# Altium footprint library connectors.PcbLib: 98 footprints (part 7 of 7)
Each footprint in its own frame and in the unit in brackets; x right, y up, seen from the top. Pads: shape width x height; smd on the part's side, far side on the other; paste and mask are expansions set on the pad; w line width, h text height; cw(c..) or ccw(c..) is an arc to the next point about the centre after c.
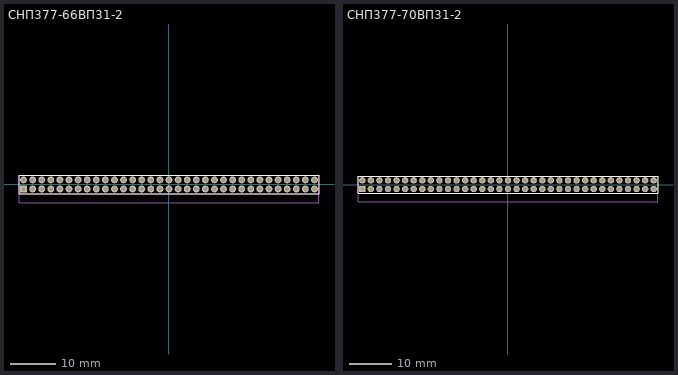
[diagram p6: the footprints below, top view; thin cyan lines are the x and y axes]

## СНП377-66ВП31-2 [mm] "Вилка серии СНП377, угловая, двухрядная, 66 выводов"
height 4
pads (66):
  rect 1.5x1.5 hole 0.9: 1(-32,-1)
  round 1.5 hole 0.9: 2(-32,1) 3(-30,-1) 4(-30,1) 5(-28,-1) 6(-28,1) 7(-26,-1) 8(-26,1) 9(-24,-1) 10(-24,1) 11(-22,-1) 12(-22,1) 13(-20,-1) 14(-20,1) 15(-18,-1) 16(-18,1) 17(-16,-1) 18(-16,1) 19(-14,-1) 20(-14,1) 21(-12,-1) 22(-12,1) 23(-10,-1) 24(-10,1) 25(-8,-1) 26(-8,1) 27(-6,-1) 28(-6,1) 29(-4,-1) 30(-4,1) 31(-2,-1) 32(-2,1) 33(0,-1) 34(0,1) 35(2,-1) 36(2,1) 37(4,-1) 38(4,1) 39(6,-1) 40(6,1) 41(8,-1) 42(8,1) 43(10,-1) 44(10,1) 45(12,-1) 46(12,1) 47(14,-1) 48(14,1) 49(16,-1) 50(16,1) 51(18,-1) 52(18,1) 53(20,-1) 54(20,1) 55(22,-1) 56(22,1) 57(24,-1) 58(24,1) 59(26,-1) 60(26,1) 61(28,-1) 62(28,1) 63(30,-1) 64(30,1) 65(32,-1) 66(32,1)
Top Overlay:
  lines w0.2: -33,-2 -33,2 33,2 33,-2 -33,-2
Top Assy:
  circle w0.4: c-32.1,-1.1 r0.2
  lines w0.1: -33,-2 33,-2 33,2 -33,2 -33,-2
Top Cortyard:
  lines w0.05: -33,-4 33,-4 33,2 -33,2 -33,-4

## СНП377-70ВП31-2 [mm] "Вилка серии СНП377, угловая, двухрядная, 70 выводов"
height 4
pads (70):
  rect 1.5x1.5 hole 0.9: 1(-34,-1)
  round 1.5 hole 0.9: 2(-34,1) 3(-32,-1) 4(-32,1) 5(-30,-1) 6(-30,1) 7(-28,-1) 8(-28,1) 9(-26,-1) 10(-26,1) 11(-24,-1) 12(-24,1) 13(-22,-1) 14(-22,1) 15(-20,-1) 16(-20,1) 17(-18,-1) 18(-18,1) 19(-16,-1) 20(-16,1) 21(-14,-1) 22(-14,1) 23(-12,-1) 24(-12,1) 25(-10,-1) 26(-10,1) 27(-8,-1) 28(-8,1) 29(-6,-1) 30(-6,1) 31(-4,-1) 32(-4,1) 33(-2,-1) 34(-2,1) 35(0,-1) 36(0,1) 37(2,-1) 38(2,1) 39(4,-1) 40(4,1) 41(6,-1) 42(6,1) 43(8,-1) 44(8,1) 45(10,-1) 46(10,1) 47(12,-1) 48(12,1) 49(14,-1) 50(14,1) 51(16,-1) 52(16,1) 53(18,-1) 54(18,1) 55(20,-1) 56(20,1) 57(22,-1) 58(22,1) 59(24,-1) 60(24,1) 61(26,-1) 62(26,1) 63(28,-1) 64(28,1) 65(30,-1) 66(30,1) 67(32,-1) 68(32,1) 69(34,-1) 70(34,1)
Top Overlay:
  lines w0.2: -35,-2 35,-2 35,2 -35,2 -35,-2
Top Assy:
  circle w0.4: c-34.1,-1.1 r0.2
  lines w0.1: -35,-2 -35,2 35,2 35,-2 -35,-2
Top Cortyard:
  lines w0.05: -35,-4 35,-4 35,2 -35,2 -35,-4